# Altium integrated library Silica_IntLib.IntLib: 303 symbols (part 2 of 3)
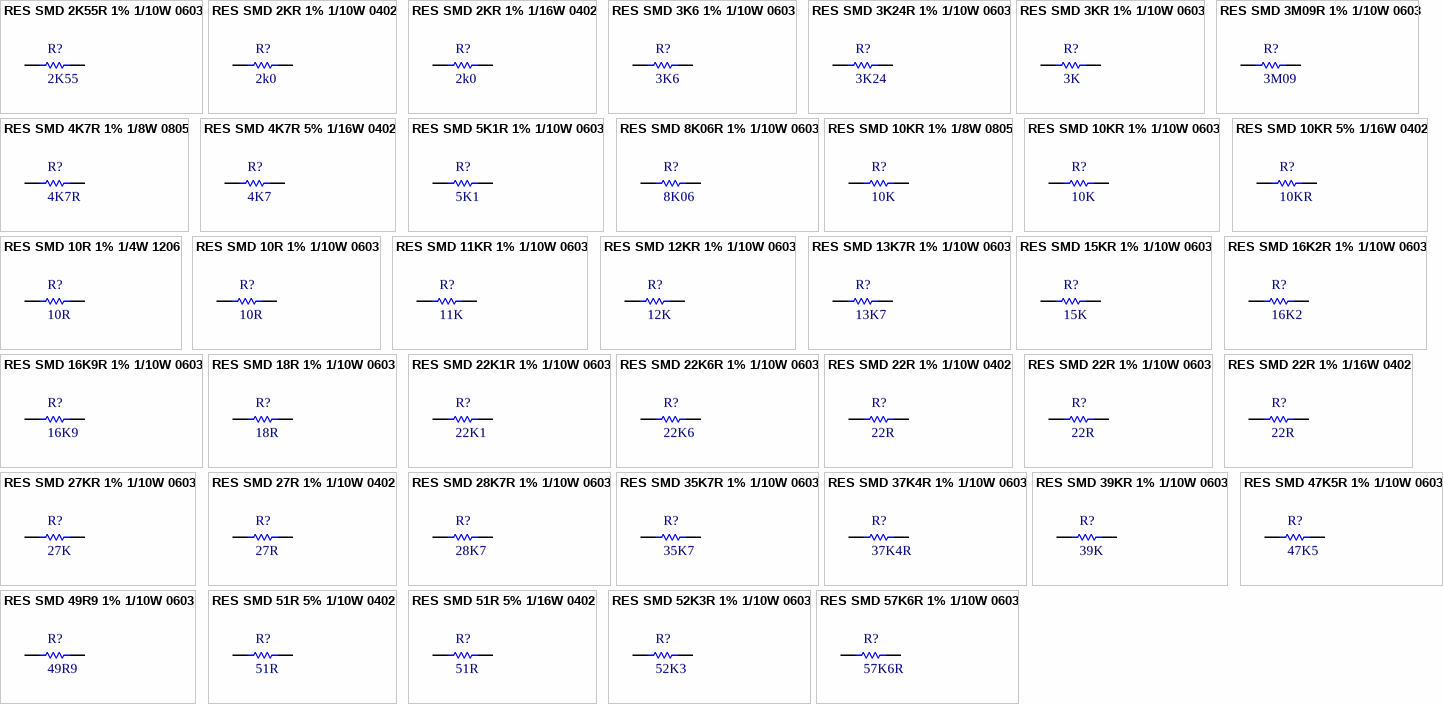
[diagram p10: symbols RES SMD 2K55R 1% 1/10W 0603 to RES SMD 57K6R 1% 1/10W 0603]

## RES SMD 4K7R 1% 1/8W 0805
designator R?, comment 4K7R
4.7 kOhms ±1% 0.125W, 1/8W Chip Resistor 0805 (2012 Metric) Moisture Resistant Thick Film; Manufacturer 1: Yageo; Manufacturer Part Number 1: RC0805FR-074K7P
footprint SMD_0805 (Generic 0805 SMD footprint)
pins: 1, 2

## RES SMD 4K7R 5% 1/16W 0402
designator R?, comment 4K7
4.7 kOhms ±5% 0.063W, 1/16W Chip Resistor 0402 (1005 Metric) Moisture Resistant Thick Film; Manufacturer 1: Yageo; Manufacturer Part Number 1: RC0402JR-074K7L
footprint SMD_0402
pins: 1, 2

## RES SMD 5K1R 1% 1/10W 0603
designator R?, comment 5K1
5.1 kOhms ±1% 0.1W, 1/10W Chip Resistor 0603 (1608 Metric) Automotive AEC-Q200 Thick Film; Manufacturer 1: Stackpole Electronics Inc; Manufacturer Part Number 1: RMCF0603FT5K10; VALUE: 5k1
footprint SMD_0603 (General SMD 0603 footprint)
pins: 1, 2

## RES SMD 8K06R 1% 1/10W 0603
designator R?, comment 8K06
8.06 kOhms ±1% 0.1W, 1/10W Chip Resistor 0603 (1608 Metric) Automotive AEC-Q200 Thick Film; Manufacturer Part Number 1: CRCW06038K06FKEA; Manufacturer 1: Vishay Dale; VALUE: 8K06 1%
footprint SMD_0603 (General SMD 0603 footprint)
pins: 1, 2

## RES SMD 10KR 1% 1/8W 0805
designator R?, comment 10K
10 kOhms ±1% 0.125W, 1/8W Chip Resistor 0805 (2012 Metric) Automotive AEC-Q200 Thick Film; Manufacturer Part Number 1: CRCW080510K0FKEA; Manufacturer 1: Vishay Dale
footprint SMD_0805 (Generic 0805 SMD footprint)
pins: 1, 2

## RES SMD 10KR 1% 1/10W 0603
designator R?, comment 10K
10 kOhms ±1% 0.1W, 1/10W Chip Resistor 0603 (1608 Metric) Automotive AEC-Q200 Thick Film; Part Number 1: ERJ-3EKF1002V; Manufacturer 1: Panasonic Electronic Components; VALUE: 10K
footprint SMD_0603 (General SMD 0603 footprint)
pins: 1, 2

## RES SMD 10KR 5% 1/16W 0402
designator R?, comment 10KR
10 kOhms ±5% 0.063W, 1/16W Chip Resistor 0402 (1005 Metric) Moisture Resistant Thick Film; Manufacturer 1: Yageo; Manufacturer Part Number 1: RC0402JR-0710KL; VALUE: 10K
footprint SMD_0402
pins: 1, 2

## RES SMD 10R 1% 1/4W 1206
designator R?, comment 10R
10 Ohms ±1% 0.25W, 1/4W Chip Resistor 1206 (3216 Metric) Automotive AEC-Q200 Thick Film; Manufacturer 1: Stackpole Electronics Inc; Manufacturer Part Number 1: RMCF1206FT10R0; VALUE: 10R
footprint SMD_1206 (General SMD 1206 footprint)
pins: 1, 2

## RES SMD 10R 1% 1/10W 0603
designator R?, comment 10R
10 Ohms ±1% 0.1W, 1/10W Chip Resistor 0603 (1608 Metric) Automotive AEC-Q200 Thick Film; Manufacturer 1: Panasonic Electronic Components; Manufacturer Part Number 1: ERJ-3EKF10R0V; VALUE: 10R 1%
footprint SMD_0603 (General SMD 0603 footprint)
pins: 1, 2

## RES SMD 11KR 1% 1/10W 0603
designator R?, comment 11K
11 kOhms ±1% 0.1W, 1/10W Chip Resistor 0603 (1608 Metric) Automotive AEC-Q200 Thick Film; Manufacturer 1: Vishay Dale; Manufacturer Part Number 1: CRCW060311K0FKEA
footprint SMD_0603 (General SMD 0603 footprint)
pins: 1, 2

## RES SMD 12KR 1% 1/10W 0603
designator R?, comment 12K
12 kOhms ±1% 0.1W, 1/10W Chip Resistor 0603 (1608 Metric) Automotive AEC-Q200 Thick Film; Manufacturer Part Number 1: ERJ-3EKF1202V; Manufacturer 1: Panasonic Electronic Components
footprint SMD_0603 (General SMD 0603 footprint)
pins: 1, 2

## RES SMD 13K7R 1% 1/10W 0603
designator R?, comment 13K7
13.7 kOhms ±1% 0.1W, 1/10W Chip Resistor 0603 (1608 Metric) Automotive AEC-Q200 Thick Film; Manufacturer 1: Stackpole Electronics Inc; Manufacturer Part Number 1: RMCF0603FT13K7
footprint SMD_0603 (General SMD 0603 footprint)
pins: 1, 2

## RES SMD 15KR 1% 1/10W 0603
designator R?, comment 15K
15 kOhms ±1% 0.1W, 1/10W Chip Resistor 0603 (1608 Metric) Automotive AEC-Q200 Thick Film; Manufacturer 1: Panasonic Electronic Components; Manufacturer Part Number 1: ERJ-3EKF1502V
footprint SMD_0603 (General SMD 0603 footprint)
pins: 1, 2

## RES SMD 16K2R 1% 1/10W 0603
designator R?, comment 16K2
16.2 kOhms ±1% 0.1W, 1/10W Chip Resistor 0603 (1608 Metric) Automotive AEC-Q200 Thick Film; Manufacturer 1: Vishay Dale; Manufacturer Part Number 1: CRCW060316K2FKEA; VALUE: 16K2 1%
footprint SMD_0603 (General SMD 0603 footprint)
pins: 1, 2

## RES SMD 16K9R 1% 1/10W 0603
designator R?, comment 16K9
16.9 kOhms ±1% 0.1W, 1/10W Chip Resistor 0603 (1608 Metric) Automotive AEC-Q200 Thick Film; Manufacturer Part Number 1: ERJ-3EKF1692V; Manufacturer 1: Panasonic Electronic Components; VALUE: 16K9 1%
footprint SMD_0603 (General SMD 0603 footprint)
pins: 1, 2

## RES SMD 18R 1% 1/10W 0603
designator R?, comment 18R
18 Ohms ±1% 0.1W, 1/10W Chip Resistor 0603 (1608 Metric) Moisture Resistant Thick Film; Manufacturer Part Number 1: RC0603FR-0718RL; Manufacturer 1: Yageo
footprint SMD_0603 (General SMD 0603 footprint)
pins: 1, 2

## RES SMD 22K1R 1% 1/10W 0603
designator R?, comment 22K1
22.1 kOhms ±1% 0.1W, 1/10W Chip Resistor 0603 (1608 Metric) Automotive AEC-Q200 Thick Film; Manufacturer Part Number 1: CRCW060322K1FKEA; Manufacturer 1: Vishay Dale
footprint SMD_0603 (General SMD 0603 footprint)
pins: 1, 2

## RES SMD 22K6R 1% 1/10W 0603
designator R?, comment 22K6
22.6 kOhms ±1% 0.1W, 1/10W Chip Resistor 0603 (1608 Metric) Automotive AEC-Q200 Thick Film; Manufacturer 1: Vishay Dale; VISHAY: CRCW060322K6FKEA; Manufacturer Part Number 1: CRCW060322K6FKEA
footprint SMD_0603 (General SMD 0603 footprint)
pins: 1, 2

## RES SMD 22R 1% 1/10W 0402
designator R?, comment 22R
22 Ohm ±1% 0.1W, 1/10W Chip Resistor 0402 (1005 Metric) Automotive AEC-Q200 Thick Film; Manufacturer 1: Panasonic Electronic Components; Manufacturer Part Number 1: ERJ-2RKF22R0X
footprint SMD_0402
pins: 1, 2

## RES SMD 22R 1% 1/10W 0603
designator R?, comment 22R
22 Ohms ±1% 0.1W, 1/10W Chip Resistor 0603 (1608 Metric) Automotive AEC-Q200 Thick Film; Manufacturer Part Number 1: ERJ-3EKF22R0V; Manufacturer 1: Panasonic Electronic Components
footprint SMD_0603 (General SMD 0603 footprint)
pins: 1, 2

## RES SMD 22R 1% 1/16W 0402
designator R?, comment 22R
22 Ohm ±1% 0.063W, 1/16W Chip Resistor 0402 (1005 Metric) Moisture Resistant Thick Film; Manufacturer 1: Bourns Inc.; Manufacturer Part Number 1: CR0402-FX-22R0GLF; VALUE: 22R
footprint SMD_0402
pins: 1, 2

## RES SMD 27KR 1% 1/10W 0603
designator R?, comment 27K
27 kOhms ±1% 0.1W, 1/10W Chip Resistor 0603 (1608 Metric) Automotive AEC-Q200 Thick Film; Manufacturer Part Number 1: ERJ-3EKF2702V; Manufacturer 1: Panasonic Electronic Components; VALUE: 27K 1%
footprint SMD_0603 (General SMD 0603 footprint)
pins: 1, 2

## RES SMD 27R 1% 1/10W 0402
designator R?, comment 27R
27 Ohm ±1% 0.1W, 1/10W Chip Resistor 0402 (1005 Metric) Automotive AEC-Q200 Thick Film; Manufacturer 1: Panasonic Electronic Components; Manufacturer Part Number 1: ERJ-2RKF27R0X; VALUE: 27R
footprint SMD_0402
pins: 1, 2

## RES SMD 28K7R 1% 1/10W 0603
designator R?, comment 28K7
28.7 kOhms ±1% 0.1W, 1/10W Chip Resistor 0603 (1608 Metric) Automotive AEC-Q200 Thick Film; Manufacturer 1: Vishay Dale; Manufacturer Part Number 1: CRCW060328K7FKEA
footprint SMD_0603 (General SMD 0603 footprint)
pins: 1, 2

## RES SMD 35K7R 1% 1/10W 0603
designator R?, comment 35K7
35.7 kOhms ±1% 0.1W, 1/10W Chip Resistor 0603 (1608 Metric) Automotive AEC-Q200 Thick Film; Manufacturer Part Number 1: ERJ-3EKF3572V; Manufacturer 1: Panasonic Electronic Components; VALUE: 35K7 1%
footprint SMD_0603 (General SMD 0603 footprint)
pins: 1, 2

## RES SMD 37K4R 1% 1/10W 0603
designator R?, comment 37K4R
37.4 kOhms ±1% 0.1W, 1/10W Chip Resistor 0603 (1608 Metric) Automotive AEC-Q200 Thick Film; Manufacturer 1: Panasonic Electronic Components; Manufacturer Part Number 1: ERJ-3EKF3742V; VALUE: 37K4 1%
footprint SMD_0603 (General SMD 0603 footprint)
pins: 1, 2

## RES SMD 39KR 1% 1/10W 0603
designator R?, comment 39K
39 kOhms ±1% 0.1W, 1/10W Chip Resistor 0603 (1608 Metric) Automotive AEC-Q200 Thick Film; Manufacturer 1: Stackpole Electronics Inc; Manufacturer Part Number 1: RMCF0603FT39K0; VALUE: 39K 1%
footprint SMD_0603 (General SMD 0603 footprint)
pins: 1, 2

## RES SMD 47K5R 1% 1/10W 0603
designator R?, comment 47K5
47.5 kOhms ±1% 0.1W, 1/10W Chip Resistor 0603 (1608 Metric)  Thick Film; Manufacturer 1: Vishay Dale; Manufacturer Part Number 1: CRCW060347K5FKEAC
footprint SMD_0603 (General SMD 0603 footprint)
pins: 1, 2

## RES SMD 49R9 1% 1/10W 0603
designator R?, comment 49R9
49.9 Ohms ±1% 0.1W, 1/10W Chip Resistor 0603 (1608 Metric) Automotive AEC-Q200 Thick Film; Manufacturer 1: Panasonic Electronic Components; Manufacturer Part Number 1: ERJ-3EKF49R9V; VALUE: 49K9 1%
footprint SMD_0603 (General SMD 0603 footprint)
pins: 1, 2

## RES SMD 51R 5% 1/10W 0402
designator R?, comment 51R
51 Ohms ±5% 0.1W, 1/10W Chip Resistor 0402 (1005 Metric) Automotive AEC-Q200 Thick Film; Manufacturer 1: Panasonic Electronic Components; Manufacturer Part Number 1: ERJ-2GEJ510X; VALUE: 51R
footprint SMD_0402
pins: 1, 2

## RES SMD 51R 5% 1/16W 0402
designator R?, comment 51R
51 Ohms ±5% 0.063W, 1/16W Chip Resistor 0402 (1005 Metric) Moisture Resistant Thick Film; Manufacturer 1: Yageo; Manufacturer Part Number 1: RC0402JR-0751RL; VALUE: 51R
footprint SMD_0402
pins: 1, 2

## RES SMD 52K3R 1% 1/10W 0603
designator R?, comment 52K3
52.3 kOhms ±1% 0.1W, 1/10W Chip Resistor 0603 (1608 Metric) Moisture Resistant Thick Film; Manufacturer 1: Yageo; Part Number 1: RC0603FR-0752K3L; VALUE: 52.3K
footprint SMD_0603 (General SMD 0603 footprint)
pins: 1, 2

## RES SMD 57K6R 1% 1/10W 0603
designator R?, comment 57K6R
57.6 kOhms ±1% 0.1W, 1/10W Chip Resistor 0603 (1608 Metric) Automotive AEC-Q200 Thick Film; Manufacturer 1: Panasonic Electronic Components; Manufacturer Part Number 1: ERJ-3EKF5762V; VALUE: 57K6R 1%
footprint SMD_0603 (General SMD 0603 footprint)
pins: 1, 2

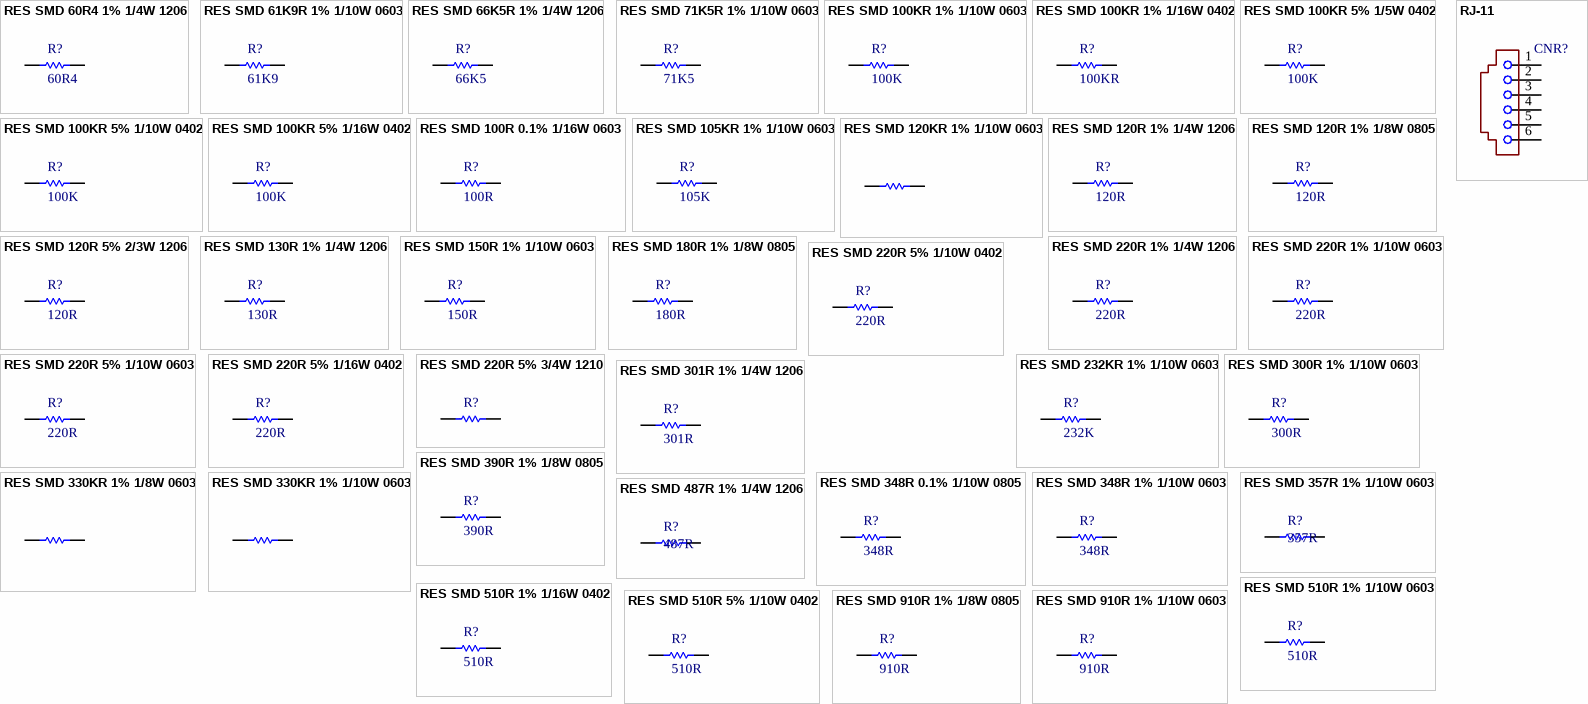
[diagram p6: symbols RES SMD 60R4 1% 1/4W 1206 to RJ-11]

## RES SMD 60R4 1% 1/4W 1206
designator R?, comment 60R4
60.4 Ohms ±1% 0.25W, 1/4W Chip Resistor 1206 (3216 Metric) Automotive AEC-Q200 Thick Film; Manufacturer Part Number 1: ERJ-8ENF60R4V; Manufacturer 1: Panasonic Electronic Components; VALUE: 60R4 1%
footprint SMD_1206 (General SMD 1206 footprint)
pins: 1, 2

## RES SMD 61K9R 1% 1/10W 0603
designator R?, comment 61K9
61.9 kOhms ±1% 0.1W, 1/10W Chip Resistor 0603 (1608 Metric) Automotive AEC-Q200 Thick Film; Manufacturer Part Number 1: ERJ-3EKF6192V; Manufacturer 1: Panasonic Electronic Components
footprint SMD_0603 (General SMD 0603 footprint)
pins: 1, 2

## RES SMD 66K5R 1% 1/4W 1206
designator R?, comment 66K5
66.5 kOhms ±1% 0.25W, 1/4W Chip Resistor 1206 (3216 Metric) Automotive AEC-Q200 Thick Film; Manufacturer 1: Panasonic Electronic Components; Manufacturer Part Number 1: ERJ-8ENF6652V
footprint SMD_1206 (General SMD 1206 footprint)
pins: 1, 2

## RES SMD 71K5R 1% 1/10W 0603
designator R?, comment 71K5
71.5 kOhms ±1% 0.1W, 1/10W Chip Resistor 0603 (1608 Metric) Automotive AEC-Q200 Thick Film; Manufacturer 1: Vishay Dale; vishay: CRCW060371K5FKEA; Manufacturer Part Number 1: CRCW060371K5FKEA
footprint SMD_0603 (General SMD 0603 footprint)
pins: 1, 2

## RES SMD 100KR 1% 1/10W 0603
designator R?, comment 100K
100 kOhms ±1% 0.1W, 1/10W Chip Resistor 0603 (1608 Metric)  Thick Film; Part Number 1: CRG0603F100K; Manufacturer 1: TE Connectivity Passive Product
footprint SMD_0603 (General SMD 0603 footprint)
pins: 1, 2

## RES SMD 100KR 1% 1/16W 0402
designator R?, comment 100KR
100 kOhms ±1% 0.063W, 1/16W Chip Resistor 0402 (1005 Metric) Automotive AEC-Q200 Thick Film; Manufacturer 1: Stackpole Electronics Inc; Manufacturer Part Number 1: RMCF0402FT100K; VALUE: 100K
footprint SMD_0402
pins: 1, 2

## RES SMD 100KR 5% 1/5W 0402
designator R?, comment 100K
100 kOhms ±5% 0.2W, 1/5W Chip Resistor 0402 (1005 Metric) Automotive AEC-Q200, Pulse Withstanding Thick Film; Manufacturer 1: Vishay Dale; Manufacturer Part Number 1: CRCW0402100KJNEDHP
footprint SMD_0402
pins: 1, 2

## RES SMD 100KR 5% 1/10W 0402
designator R?, comment 100K
100 kOhms ±5% 0.1W, 1/10W Chip Resistor 0402 (1005 Metric) Automotive AEC-Q200 Thick Film; Manufacturer 1: Panasonic Electronic Components; Manufacturer Part Number 1: ERJ-2GEJ104X
footprint SMD_0402
pins: 1, 2

## RES SMD 100KR 5% 1/16W 0402
designator R?, comment 100K
100 kOhms ±5% 0.063W, 1/16W Chip Resistor 0402 (1005 Metric) Automotive AEC-Q200 Thick Film; Manufacturer Part Number 1: RMCF0402JT100K; Manufacturer 1: Stackpole Electronics Inc
footprint SMD_0402
pins: 1, 2

## RES SMD 100R 0.1% 1/16W 0603
designator R?, comment 100R
100 Ohms ±0.1% 0.063W, 1/16W Chip Resistor 0603 (1608 Metric)  Thin Film; Manufacturer 1: TE Connectivity Passive Product; Manufacturer Part Number 1: CPF0603B100RE1; VALUE: 100R
footprint SMD_0603 (General SMD 0603 footprint)
pins: 1, 2

## RES SMD 105KR 1% 1/10W 0603
designator R?, comment 105K
105 kOhms ±1% 0.1W, 1/10W Chip Resistor 0603 (1608 Metric) Automotive AEC-Q200 Thick Film; Manufacturer 1: Vishay Dale; Manufacturer Part Number 1: CRCW0603105KFKEA
footprint SMD_0603 (General SMD 0603 footprint)
pins: 1, 2

## RES SMD 120KR 1% 1/10W 0603
designator R?, comment 120K
120 kOhms ±1% 0.1W, 1/10W Chip Resistor 0603 (1608 Metric)  Thin Film; Manufacturer Part Number 1: RT0603FRE07120KL; Manufacturer 1: Yageo
footprint SMD_0603 (General SMD 0603 footprint)
pins: 1, 2

## RES SMD 120R 1% 1/4W 1206
designator R?, comment 120R
120 Ohms ±1% 0.25W, 1/4W Chip Resistor 1206 (3216 Metric) Automotive AEC-Q200 Thick Film; Manufacturer Part Number 1: ERJ-8ENF1200V; Manufacturer 1: Panasonic Electronic Components
footprint SMD_1206 (General SMD 1206 footprint)
pins: 1, 2

## RES SMD 120R 1% 1/8W 0805
designator R?, comment 120R
120 Ohms ±1% 0.125W, 1/8W Chip Resistor 0805 (2012 Metric) Automotive AEC-Q200 Thick Film; Manufacturer 1: Panasonic Electronic Components; Part Number 1: ERJ-6ENF1200V
footprint SMD_0805 (Generic 0805 SMD footprint)
pins: 1, 2

## RES SMD 120R 5% 2/3W 1206
designator R?, comment 120R
120 Ohms ±5% 0.667W, 2/3W Chip Resistor 1206 (3216 Metric) Automotive AEC-Q200, Pulse Withstanding Thick Film; Manufacturer 1: Panasonic Electronic Components; Manufacturer Part Number 1: ERJ-P08J121V
footprint SMD_1206 (General SMD 1206 footprint)
pins: 1, 2

## RES SMD 130R 1% 1/4W 1206
designator R?, comment 130R
130 Ohms ±1% 0.25W, 1/4W Chip Resistor 1206 (3216 Metric) Automotive AEC-Q200 Thick Film; Manufacturer 1: Panasonic Electronic Components; Manufacturer Part Number 1: ERJ-8ENF1300V
footprint SMD_1206 (General SMD 1206 footprint)
pins: 1, 2

## RES SMD 150R 1% 1/10W 0603
designator R?, comment 150R
150 Ohms ±1% 0.1W, 1/10W Chip Resistor 0603 (1608 Metric) Automotive AEC-Q200 Thick Film; Manufacturer 1: Panasonic Electronic Components; Manufacturer Part Number 1: ERJ-3EKF1500V
footprint SMD_0603 (General SMD 0603 footprint)
pins: 1, 2

## RES SMD 180R 1% 1/8W 0805
designator R?, comment 180R
180 Ohms ±1% 0.125W, 1/8W Chip Resistor 0805 (2012 Metric) Automotive AEC-Q200 Thick Film; Manufacturer 1: Panasonic Electronic Components; VALUE: 180R 1%; Supplier Part Number 1: P180CTR-ND
footprint SMD_0805 (Generic 0805 SMD footprint)
pins: 1, 2

## RES SMD 220R 1% 1/4W 1206
designator R?, comment 220R
220 Ohms ±1% 0.25W, 1/4W Chip Resistor 1206 (3216 Metric) Automotive AEC-Q200, Moisture Resistant Thick Film; Manufacturer Part Number 1: AC1206FR-07220RL; Manufacturer 1: Yageo; VALUE: 220R 1%
footprint SMD_1206 (General SMD 1206 footprint)
pins: 1, 2

## RES SMD 220R 1% 1/10W 0603
designator R?, comment 220R
220 Ohms ±1% 0.1W, 1/10W Chip Resistor 0603 (1608 Metric) Automotive AEC-Q200 Thick Film; Manufacturer 1: Stackpole Electronics Inc; Manufacturer Part Number 1: RMCF0603FT220R
footprint SMD_0603 (General SMD 0603 footprint)
pins: 1, 2

## RES SMD 220R 5% 1/10W 0402
designator R?, comment 220R
220 Ohms ±5% 0.1W, 1/10W Chip Resistor 0402 (1005 Metric) Automotive AEC-Q200 Thick Film; Manufacturer 1: Panasonic Electronic Components; Manufacturer Part Number 1: ERJ-2GEJ221X; VALUE: 220R
footprint SMD_0402
pins: 1, 2

## RES SMD 220R 5% 1/10W 0603
designator R?, comment 220R
220 Ohms ±5% 0.1W, 1/10W Chip Resistor 0603 (1608 Metric) Automotive AEC-Q200 Thick Film; Manufacturer 1: Panasonic Electronic Components; Manufacturer Part Number 1: ERJ-3GEYJ221V
footprint SMD_0603 (General SMD 0603 footprint)
pins: 1, 2

## RES SMD 220R 5% 1/16W 0402
designator R?, comment 220R
220 Ohms ±5% 0.063W, 1/16W Chip Resistor 0402 (1005 Metric) Moisture Resistant Thick Film; Manufacturer Part Number 1: RC0402JR-07220RL; Manufacturer 1: Yageo; VALUE: 220R
footprint SMD_0402
pins: 1, 2

## RES SMD 220R 5% 3/4W 1210
designator R?, comment 220R  (value not drawn)
220 Ohms ±5% 0.75W, 3/4W Chip Resistor 1210 (3225 Metric) Automotive AEC-Q200, Pulse Withstanding Thick Film; Manufacturer Part Number 1: CRCW1210220RJNEAHP; Manufacturer 1: Vishay Dale
footprint SMD_1206 (General SMD 1206 footprint)
pins: 1, 2

## RES SMD 232KR 1% 1/10W 0603
designator R?, comment 232K
232 kOhms ±1% 0.1W, 1/10W Chip Resistor 0603 (1608 Metric) Moisture Resistant Thick Film; Manufacturer 1: Yageo; Manufacturer Part Number 1: RC0603FR-07232KL
footprint SMD_0603 (General SMD 0603 footprint)
pins: 1, 2

## RES SMD 300R 1% 1/10W 0603
designator R?, comment 300R
300 Ohms ±1% 0.1W, 1/10W Chip Resistor 0603 (1608 Metric) Automotive AEC-Q200 Thick Film; Manufacturer 1: Panasonic Electronic Components; Manufacturer Part Number 1: ERJ-3EKF3000V
footprint SMD_0603 (General SMD 0603 footprint)
pins: 1, 2

## RES SMD 301R 1% 1/4W 1206
designator R?, comment 301R
301 Ohms ±1% 0.25W, 1/4W Chip Resistor 1206 (3216 Metric) Automotive AEC-Q200 Thick Film; Manufacturer 1: Panasonic Electronic Components; Manufacturer Part Number 1: ERJ-8ENF3010V
footprint SMD_1206 (General SMD 1206 footprint)
pins: 1, 2

## RES SMD 330KR 1% 1/8W 0603
designator R?, comment 330K
330 kOhms ±1% 0.125W, 1/8W Chip Resistor 0603 (1608 Metric) Anti-Sulfur Thin Film; Manufacturer 1: Vishay Beyschlag; Manufacturer Part Number 1: MCT06030C3303FP500
footprint SMD_0603 (General SMD 0603 footprint)
pins: 1, 2

## RES SMD 330KR 1% 1/10W 0603
designator R?, comment 330K
330 kOhms ±1% 0.1W, 1/10W Chip Resistor 0603 (1608 Metric) Automotive AEC-Q200, Moisture Resistant Thick Film; Manufacturer 1: TE Connectivity Passive Product; Manufacturer Part Number 1: CRGCQ0603F330K
footprint SMD_0603 (General SMD 0603 footprint)
pins: 1, 2

## RES SMD 348R 0.1% 1/10W 0805
designator R?, comment 348R
348 Ohms ±0.1% 0.1W, 1/10W Chip Resistor 0805 (2012 Metric)  Thin Film; Manufacturer 1: TE Connectivity Passive Product; Manufacturer Part Number 1: RN73C2A348RBTDF; VALUE: 348R
footprint SMD_0805 (Generic 0805 SMD footprint)
pins: 1, 2

## RES SMD 348R 1% 1/10W 0603
designator R?, comment 348R
348 Ohms ±1% 0.1W, 1/10W Chip Resistor 0603 (1608 Metric) Moisture Resistant Thick Film; Manufacturer 1: Yageo; Manufacturer Part Number 1: RC0603FR-07348RL
footprint SMD_0603 (General SMD 0603 footprint)
pins: 1, 2

## RES SMD 357R 1% 1/10W 0603
designator R?, comment 357R
357 Ohms ±1% 0.1W, 1/10W Chip Resistor 0603 (1608 Metric) Moisture Resistant Thick Film; Manufacturer Part Number 1: RC0603FR-07357RL; Manufacturer 1: Yageo; http://br.mouser.com/Passive-Components/Resistors/_/N-5g9n?P=1z0zlsdZ1z0znqlZ1yzs6iiZ1z0zls5Z1yzvlveZ1z0zls8Z1z0zlfjZ1z0wnw6Z1z0t6ciZ1z0rxo7Z1z0vl7rZ1yzp0shZ1yzp15tZ1yzp0sgZ1yzp0fgZ1z0vkuqZ1yzp15yZ1yzp0ffZ1yzp15xZ1z0vocvZ1z0vocwZ1z0vo2aZ1z0vnvoZ1z0wljoZ1y: LINK
footprint SMD_0603 (General SMD 0603 footprint)
pins: 1, 2

## RES SMD 390R 1% 1/8W 0805
designator R?, comment 390R
390 Ohms ±1% 0.125W, 1/8W Chip Resistor 0805 (2012 Metric) Automotive AEC-Q200 Thick Film; Manufacturer 1: Panasonic Electronic Components; Manufacturer Part Number 1: ERJ-6ENF3900V; VALUE: 390R 1%
footprint SMD_0805 (Generic 0805 SMD footprint)
pins: 1, 2

## RES SMD 487R 1% 1/4W 1206
designator R?, comment 487R
487 Ohms ±1% 0.25W, 1/4W Chip Resistor 1206 (3216 Metric) Moisture Resistant Thick Film; Manufacturer 1: Yageo; Manufacturer Part Number 1: RC1206FR-07487RL
footprint SMD_1206 (General SMD 1206 footprint)
pins: 1, 2

## RES SMD 510R 1% 1/10W 0603
designator R?, comment 510R
510 Ohms ±1% 0.1W, 1/10W Chip Resistor 0603 (1608 Metric) Automotive AEC-Q200 Thick Film; Part Number 1: ERJ-3EKF5100V; Manufacturer 1: Panasonic Electronic Components; VALUE: 510R
footprint SMD_0603 (General SMD 0603 footprint)
pins: 1, 2

## RES SMD 510R 1% 1/16W 0402
designator R?, comment 510R
510 Ohms ±1% 0.063W, 1/16W Chip Resistor 0402 (1005 Metric) Automotive AEC-Q200 Thick Film; Manufacturer 1: Stackpole Electronics Inc; Manufacturer Part Number 1: RMCF0402FT510R; VALUE: 510R
footprint SMD_0402
pins: 1, 2

## RES SMD 510R 5% 1/10W 0402
designator R?, comment 510R
510 Ohms ±5% 0.1W, 1/10W Chip Resistor 0402 (1005 Metric) Automotive AEC-Q200 Thick Film; Manufacturer 1: Panasonic Electronic Components; Manufacturer Part Number 1: ERJ-2GEJ511X; VALUE: 510R
footprint SMD_0402
pins: 1, 2

## RES SMD 910R 1% 1/8W 0805
designator R?, comment 910R
910 Ohms ±1% 0.125W, 1/8W Chip Resistor 0805 (2012 Metric) Automotive AEC-Q200 Thick Film; Manufacturer 1: Stackpole Electronics Inc; Manufacturer Part Number 1: RMCF0805FT910R; VALUE: 910R
footprint SMD_0805 (Generic 0805 SMD footprint)
pins: 1, 2

## RES SMD 910R 1% 1/10W 0603
designator R?, comment 910R
910 Ohms ±1% 0.1W, 1/10W Chip Resistor 0603 (1608 Metric) Automotive AEC-Q200 Thick Film; Manufacturer 1: Vishay Dale; Part Number 1: CRCW0603910RFKEA
footprint SMD_0603 (General SMD 0603 footprint)
pins: 1, 2

## RJ-11
designator CNR?  (value not drawn)
METALTEX: TFN-66
footprint RJ-11 6POS 90ºC METALTEX
pins: 1, 2, 3, 4, 5, 6

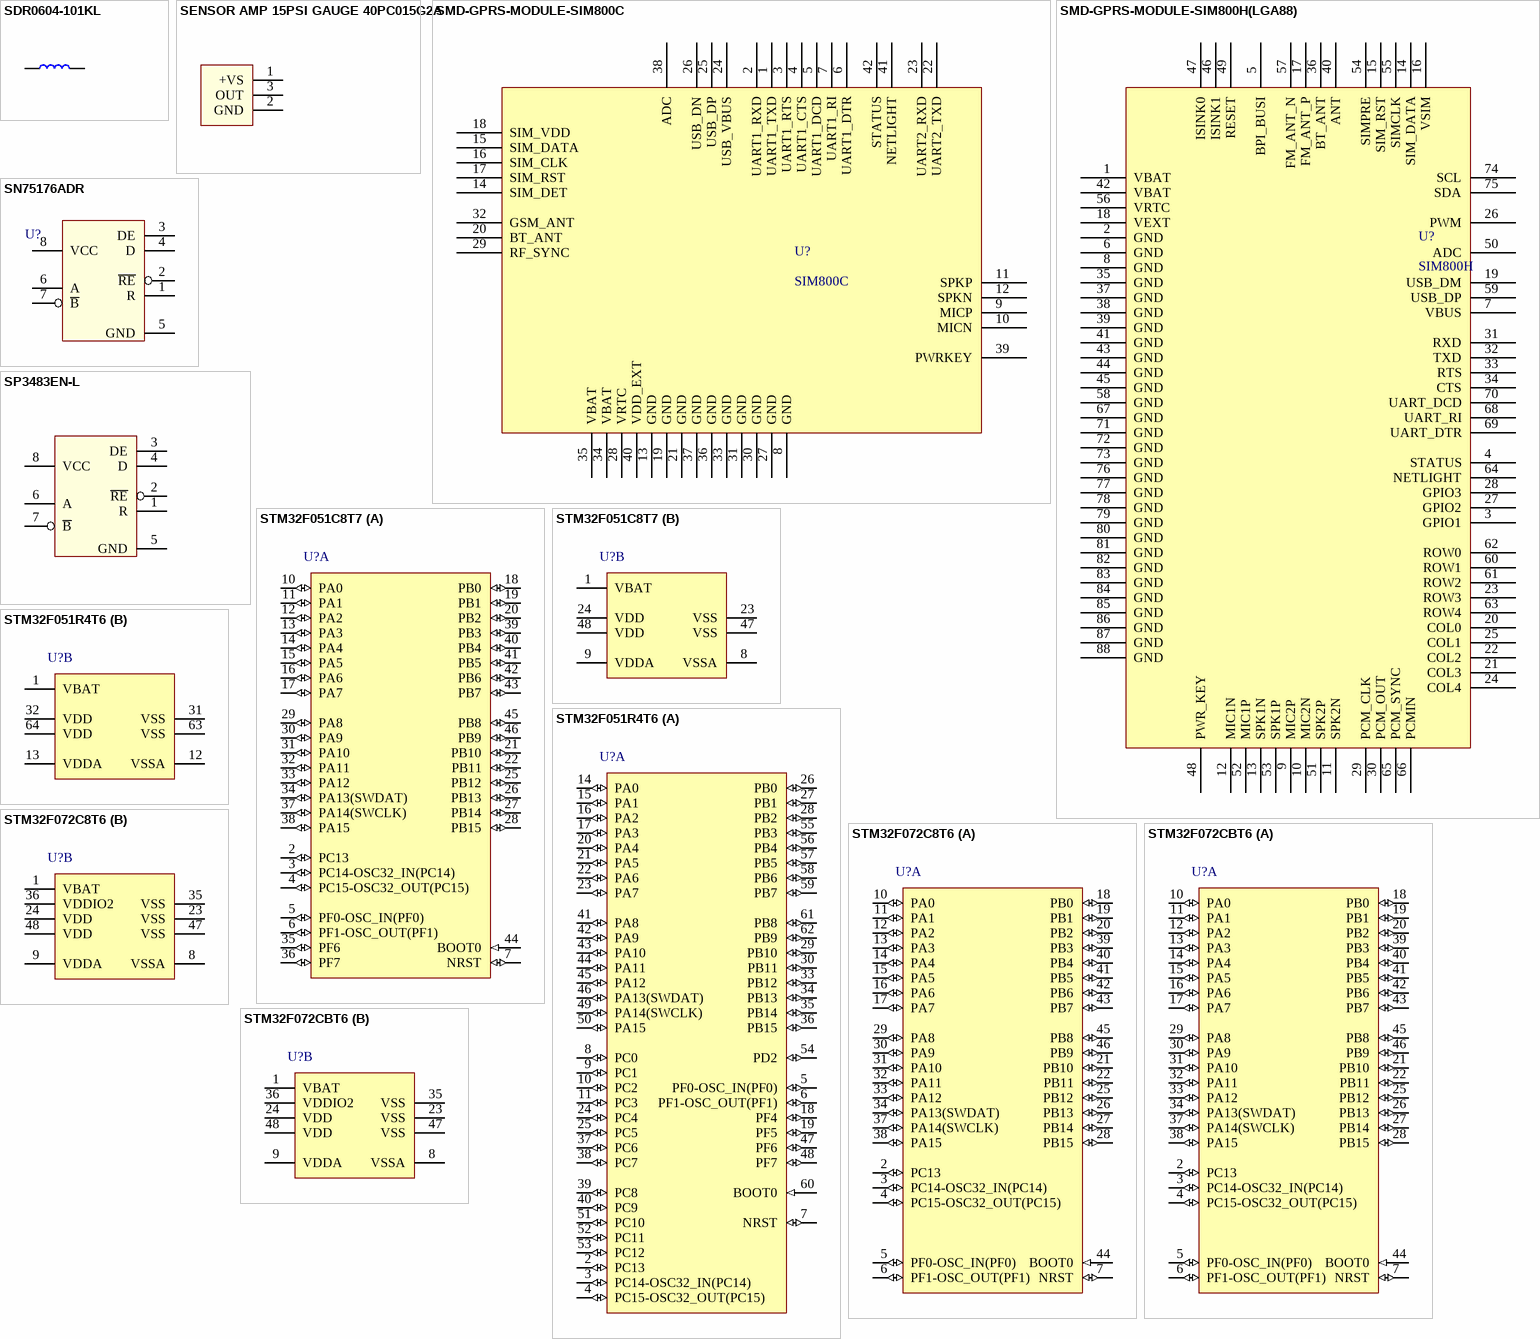
[diagram p7: symbols SDR0604-101KL to STM32F072CBT6]

## SDR0604-101KL
designator L?
IND 100uH 680mA 10% 9MHz; BOURNS: SDR0604-101KL
footprint SDR0604 (BOURNS INDUCTOR SERIES)
pins: 1, 2

## SENSOR AMP 15PSI GAUGE 40PC015G2A
designator U?, comment 40PC015G2A
Pressure Sensor 15PSI (103.42kPa) Vented Gauge Male - 0.18" (4.57mm) Tube 0.5 V ~ 4.5 V 6-DIP Module; Manufacturer 1: Honeywell Sensing and Productivity Solutions; Part Number 1: 40PC015G2A
footprint 40PC015G2A (HONEYWELL PRESSURE SENSOR)
pins: 1 +VS, 2 GND, 3 OUT, 4 NIC hidden, 5 NIC hidden, 6 NIC hidden

## SMD-GPRS-MODULE-SIM800C
designator U?, comment SIM800C
Quad-band GSM/GPRS solution with LCC and LGA pads (Alt: SIM800C-DS S2-1068B-Z1L14); Manufacturer 1: SIMCom; Manufacturer Part Number 1: SIM800C-DS S2-1068B-Z1L14
footprint LCC110P1570X1760X250-42N (SIM800C)
pins: 1 UART1_TXD, 2 UART1_RXD, 3 UART1_RTS, 4 UART1_CTS, 5 UART1_DCD, 6 UART1_DTR, 7 UART1_RI, 8 GND, 9 MICP, 10 MICN, 11 SPKP, 12 SPKN, 13 GND, 14 SIM_DET, 15 SIM_DATA, 16 SIM_CLK, 17 SIM_RST, 18 SIM_VDD, 19 GND, 20 BT_ANT, 21 GND, 22 UART2_TXD, 23 UART2_RXD, 24 USB_VBUS, 25 USB_DP, 26 USB_DN, 27 GND, 28 VRTC, 29 RF_SYNC, 30 GND, 31 GND, 32 GSM_ANT, 33 GND, 34 VBAT, 35 VBAT, 36 GND, 37 GND, 38 ADC, 39 PWRKEY, 40 VDD_EXT, 41 NETLIGHT, 42 STATUS

## SMD-GPRS-MODULE-SIM800H(LGA88)
designator U?, comment SIM800H
SMD-GPRS-MODULE-SIM800H(LGA88)
footprint LGA88-1.4-17.8x15.8x2.4mm
pins: 1 VBAT, 2 GND, 3 GPIO1, 4 STATUS, 5 BPI_BUSI, 6 GND, 7 VBUS, 8 GND, 9 MIC2P, 10 MIC2N, 11 SPK2N, 12 MIC1N, 13 SPK1N, 14 SIM_DATA, 15 SIM_RST, 16 VSIM, 17 FM_ANT_P, 18 VEXT, 19 USB_DM, 20 COL0, 21 COL3, 22 COL2, 23 ROW3, 24 COL4, 25 COL1, 26 PWM, 27 GPIO2, 28 GPIO3, 29 PCM_CLK, 30 PCM_OUT, 31 RXD, 32 TXD, 33 RTS, 34 CTS, 35 GND, 36 BT_ANT, 37 GND, 38 GND, 39 GND, 40 ANT, 41 GND, 42 VBAT, 43 GND, 44 GND, 45 GND, 46 ISINK1, 47 ISINK0, 48 PWR_KEY, 49 RESET, 50 ADC, 51 SPK2P, 52 MIC1P, 53 SPK1P, 54 SIMPRE, 55 SIMCLK, 56 VRTC, 57 FM_ANT_N, 58 GND, 59 USB_DP, 60 ROW1, 61 ROW2, 62 ROW0, 63 ROW4, 64 NETLIGHT, 65 PCM_SYNC, 66 PCMIN, 67 GND, 68 UART_RI, 69 UART_DTR, 70 UART_DCD, 71 GND, 72 GND, 73 GND, 74 SCL, 75 SDA, 76 GND, 77 GND, 78 GND, 79 GND, 80 GND, 81 GND, 82 GND, 83 GND, 84 GND, 85 GND, 86 GND, 87 GND, 88 GND